# Altium footprint library AltiumLibraries.PcbLib: 247 footprints (part 15 of 16)
Each footprint in its own frame and in the unit in brackets; x right, y up, seen from the top. Pads: shape width x height; smd on the part's side, far side on the other; paste and mask are expansions set on the pad; w line width, h text height; cw(c..) or ccw(c..) is an arc to the next point about the centre after c.
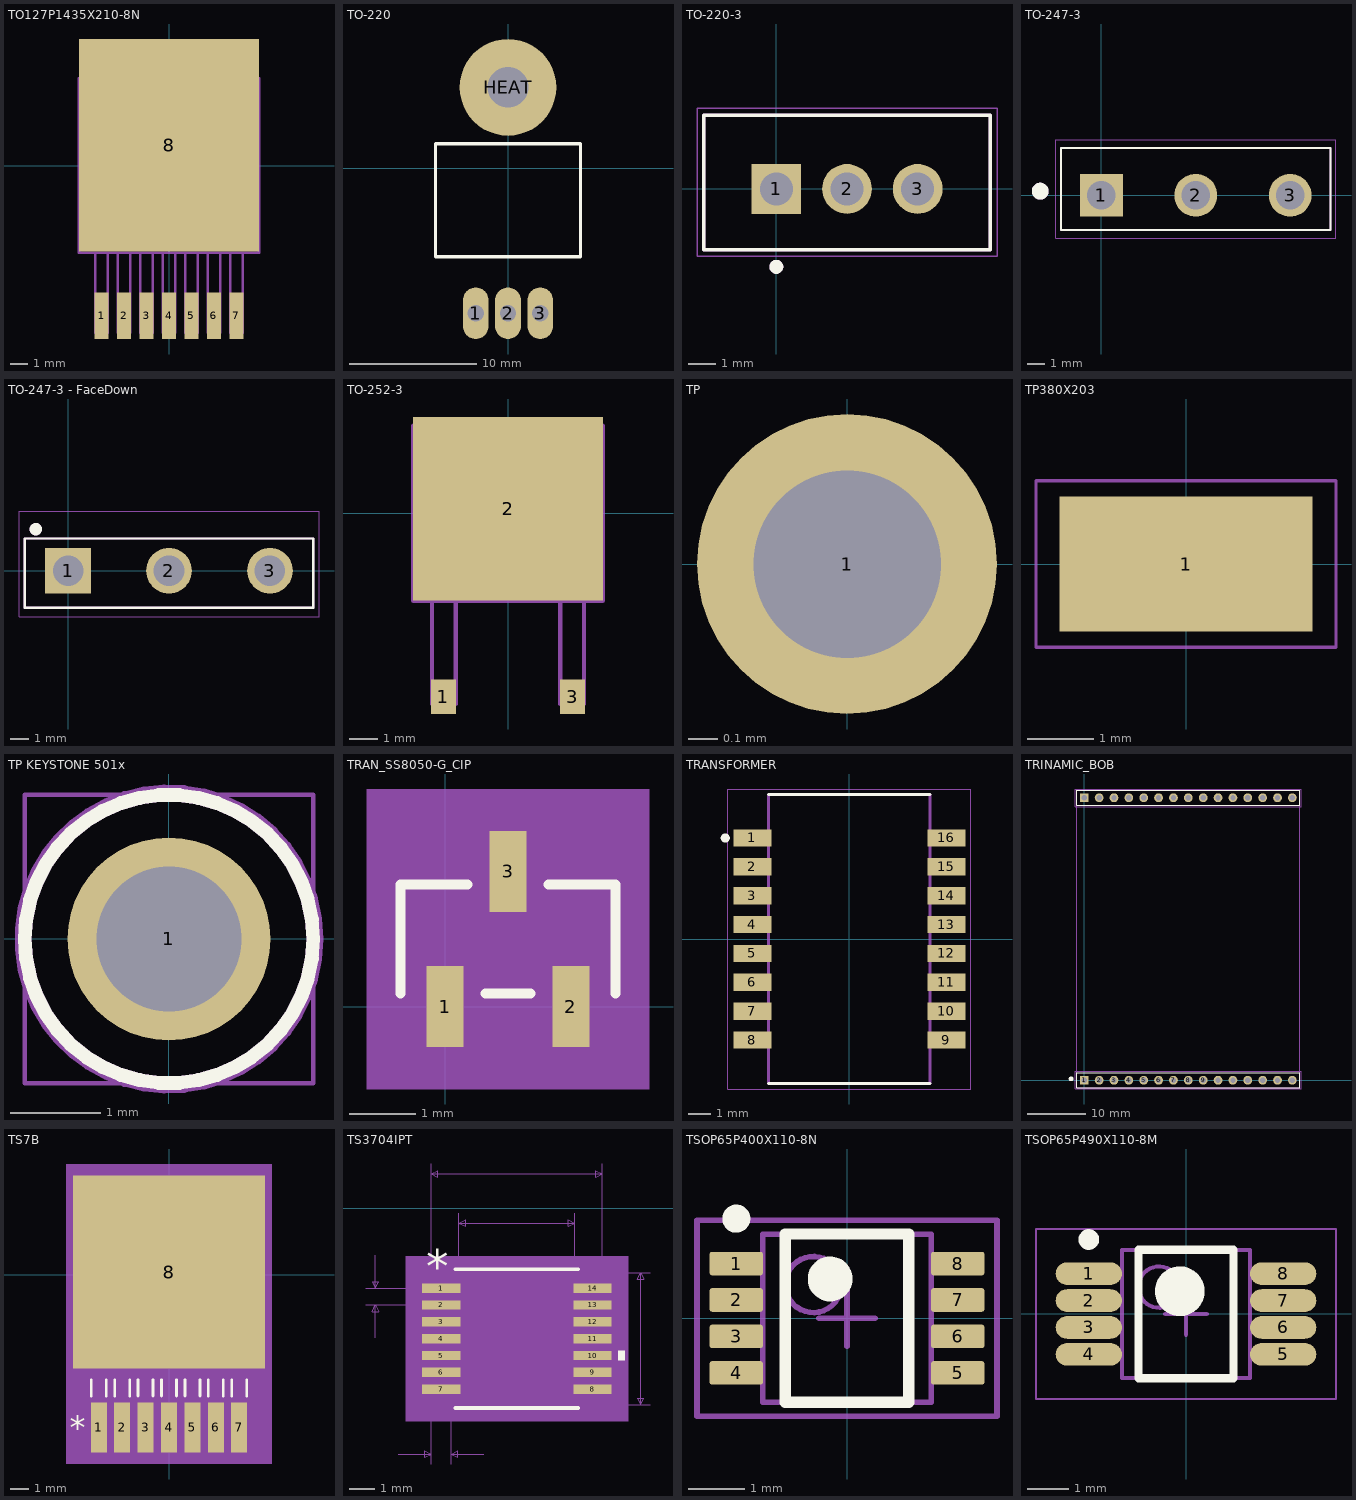
[diagram p14: the footprints below, top view; thin cyan lines are the x and y axes]

## TO127P1435X210-8N [mil]
pads (8):
  rect 31x103 smd: 1(-150,-334) 2(-100,-334) 3(-50,-334) 4(0,-334) 5(50,-334) 6(100,-334) 7(150,-334)
  rect 400x472.44 smd: 8(0,45.28)
Mechanical 13:
  lines w6: -200,-194 -200,194 200,194 200,-194 -200,-194 ; -164,-371 -136,-371 -136,-194 -164,-194 -164,-371 ; -114,-371 -86,-371 -86,-194 -114,-194 -114,-371 ; -64,-371 -36,-371 -36,-194 -64,-194 -64,-371 ; -14,-371 14,-371 14,-194 -14,-194 -14,-371 ; 36,-371 64,-371 64,-194 36,-194 36,-371 ; 86,-371 114,-371 114,-194 86,-194 86,-371 ; 136,-371 164,-371 164,-194 136,-194 136,-371
3D body "NDR0007A.stp": height 78.74, standoff -6.63, extent -200,-355.55 200,196.06

## TO-220 [mil]
pads (4):
  oval 80x160 hole 50: 1(-100,-450) 2(0,-450) 3(100,-450)
  round 300 hole 126: HEAT(0,250)
Top Overlay:
  lines w10: -225,-275 -225,75 225,75 225,-275 -225,-275

## TO-220-3 [mm]
pads (3):
  rect 1.79x1.79 hole 1.19: 1(0,0)
  round 1.79 hole 1.19: 2(2.54,0) 3(5.08,0)
Top Overlay:
  circle w0.3: c0,-2.8 r0.1
  lines w0.127: -2.6,-2.18 7.68,-2.18 7.68,2.64 -2.6,2.64 -2.6,-2.18
Mechanical 4:
  circle w0.3: c0,-2.8 r0.1
  circle w0.3: c0,-2.8 r0.1
  lines w0.127: -2.6,-2.18 -2.6,2.64 ; -2.6,-2.18 7.68,-2.18 ; -2.6,-2.18 -2.6,2.64 ; -2.6,-2.18 7.68,-2.18 ; -2.6,2.64 7.68,2.64 ; -2.6,2.64 7.68,2.64 ; 7.68,-2.18 7.68,2.64 ; 7.68,-2.18 7.68,2.64
Mechanical 16:
  lines w0.05: -2.85,-2.427 -2.85,2.893 7.93,2.893 7.93,-2.427 -2.85,-2.427

## TO-247-3 [mm]
pads (3):
  rect 2.52x2.52 hole 1.68: 1(0,0)
  round 2.52 hole 1.68: 2(5.56,0) 3(11.12,0)
Top Overlay:
  circle w0.5: c-3.6,0.24 r0.25
  lines w0.127: -2.38,-2.04 13.5,-2.04 13.5,2.78 -2.38,2.78 -2.38,-2.04
Mechanical 13:
  circle w0.5: c-3.6,0.24 r0.25
  lines w0.127: -2.38,-2.04 13.5,-2.04 13.5,2.78 -2.38,2.78 -2.38,-2.04
Mechanical 15:
  lines w0.05: -2.7,-2.53 13.82,-2.53 13.82,3.27 -2.7,3.27 -2.7,-2.53
3D body "TO-247 CASE 340L-02 Horizontal Bottom.STEP": height 6.3, standoff -12, extent -2.44,-25.55 13.56,0.35

## TO-247-3 - FaceDown [mm]
pads (3):
  rect 2.52x2.52 hole 1.68: 1(0,0)
  round 2.52 hole 1.68: 2(5.56,0) 3(11.12,0)
Top Overlay:
  circle w0.381: c-1.778,2.286 r0.152
  lines w0.127: -2.38,-2.04 -2.38,1.778 13.5,1.778 13.5,-2.04 -2.38,-2.04
Mechanical 13:
  circle w0.381: c-1.778,2.286 r0.152
  lines w0.127: -2.38,-2.04 13.5,-2.04 13.5,1.778 -2.38,1.778 -2.38,-2.04
Mechanical 15:
  lines w0.05: -2.7,-2.53 13.82,-2.53 13.82,3.27 -2.7,3.27 -2.7,-2.53
3D body "User Library-TO-247_bent_leads.step": height 5.5, standoff -6.5, extent -2.39,-26.582 13.51,0.4

## TO-252-3 [mil]
pads (3):
  rect 35x48 smd: 1(-90,-256) 3(90,-256)
  rect 265x256 smd: 2(0,6)
Mechanical 4:
  lines w6: -132,-122 132,-122 ; -132,-122 -132,122 ; -132,-122 132,-122 ; -132,-122 -132,122 ; -132,122 132,122 ; -132,122 132,122 ; -106,-266 -106,-122 ; -106,-266 -73,-266 ; -106,-266 -106,-122 ; -106,-266 -73,-266 ; -106,-122 -73,-122 ; -106,-122 -73,-122 ; -73,-266 -73,-122 ; -73,-266 -73,-122 ; 73,-266 73,-122 ; 73,-266 106,-266 ; 73,-266 73,-122 ; 73,-266 106,-266 ; 73,-122 106,-122 ; 73,-122 106,-122 ; 106,-266 106,-122 ; 106,-266 106,-122 ; 132,-122 132,122 ; 132,-122 132,122

## TP [mil] "Test point (40mil Standard)"
pads (1):
  round 40 hole 25: 1(0,0)

## TP380X203 [mm]
pads (1):
  rect 3.8x2.03 smd: 1(0,0)
Mechanical 15:
  lines w0.05: -2.25,-1.25 2.25,-1.25 2.25,1.25 -2.25,1.25 -2.25,-1.25

## TP KEYSTONE 501x [mil] "Keystone 5010-5014 & 5125-5129"
pads (1):
  round 88 hole 63: 1(0,0)
Top Overlay:
  circle w6: c0,0 r62.48
Mechanical 13:
  circle w6: c0,0 r62.48
  lines w1.97: -62.6,-62.47 62.6,-62.47 62.6,62.48 -62.6,62.48 -62.6,-62.47
Mechanical 15:
  circle w3.94: c0,0 r65
3D body "5012 (White).step": height 320.08, standoff -124.8, extent -62.6,-62.47 62.6,62.47

## TRAN_SS8050-G_CIP [mil]
pads (3):
  rect 22x48 smd paste+0 mask+0: 1(0,0) 2(74.8,0) 3(37.4,80.39)
Top Overlay:
  lines w6: -26.6,7.7 -26.6,72.7 13.3,72.7 ; 24.1,7.7 50.7,7.7 ; 61.5,72.7 101.4,72.7 101.4,7.7
Mechanical 5:
  region: -46.6,129.39 121.4,129.39 121.4,-49 -46.6,-49
Mechanical 13:
  lines w1: -21.6,12.7 96.4,12.7 96.4,67.7 -21.6,67.7 -21.6,12.7 ; -10,-10 -10,12.7 10,12.7 10,-10 -10,-10 ; 27.4,67.7 47.4,67.7 47.4,90.39 27.4,90.39 27.4,67.7 ; 64.8,-10 64.8,12.7 84.8,12.7 84.8,-10 64.8,-10
Mechanical 15:
  region: -31.6,2.7 -31.6,77.7 17.4,77.7 17.4,114.39 57.4,114.39 57.4,77.7 106.4,77.7 106.4,2.7 94.8,2.7 94.8,-34 -20,-34 -20,2.7
  lines w6: -31.6,2.7 -31.6,77.7 17.4,77.7 17.4,114.39 57.4,114.39 57.4,77.7 106.4,77.7 106.4,2.7 94.8,2.7 94.8,-34 -20,-34 -20,2.7 -31.6,2.7
3D body "TRAN_SS8050-G_CIP.step": height 41.1, standoff 0, extent -21.61,-10 96.42,90.39

## TRANSFORMER [mm]
pads (16):
  rect 1.67x0.76 smd: 1(-4.265,4.445) 2(-4.265,3.175) 3(-4.265,1.905) 4(-4.265,0.635) 5(-4.265,-0.635) 6(-4.265,-1.905) 7(-4.265,-3.175) 8(-4.265,-4.445) 9(4.265,-4.445) 10(4.265,-3.175) 11(4.265,-1.905) 12(4.265,-0.635) 13(4.265,0.635) 14(4.265,1.905) 15(4.265,3.175) 16(4.265,4.445)
Top Overlay:
  circle w0.2: c-5.461,4.445 r0.1
  lines w0.127: -3.555,-6.35 3.555,-6.35 ; -3.555,6.35 3.555,6.35
Mechanical 4:
  lines w0.127: -3.555,-6.35 -3.555,6.35 ; -3.555,-6.35 3.555,-6.35 ; -3.555,-6.35 -3.555,6.35 ; -3.555,-6.35 3.555,-6.35 ; -3.555,6.35 3.555,6.35 ; -3.555,6.35 3.555,6.35 ; 3.555,-6.35 3.555,6.35 ; 3.555,-6.35 3.555,6.35
Mechanical 15:
  lines w0.05: -5.35,-6.6 -5.35,6.6 5.35,6.6 5.35,-6.6 -5.35,-6.6

## TRINAMIC_BOB [mm]
pads (30):
  rect 1.5x1.5 hole 0.9: 1(0,0) 16(0,48.26)
  round 1.5 hole 0.9: 2(2.54,0) 3(5.08,0) 4(7.62,0) 5(10.16,0) 6(12.7,0) 7(15.24,0) 8(17.78,0) 9(20.32,0) 10(22.86,0) 11(25.4,0) 12(27.94,0) 13(30.48,0) 14(33.02,0) 15(35.56,0) 17(2.54,48.26) 18(5.08,48.26) 19(7.62,48.26) 20(10.16,48.26) 21(12.7,48.26) 22(15.24,48.26) 23(17.78,48.26) 24(20.32,48.26) 25(22.86,48.26) 26(25.4,48.26) 27(27.94,48.26) 28(30.48,48.26) 29(33.02,48.26) 30(35.56,48.26)
Top Overlay:
  circle w0.6: c-2.25,0.25 r0.1
  lines w0.2: -1.27,-1.27 36.83,-1.27 36.83,1.27 -1.27,1.27 -1.27,-1.27 ; -1.27,46.99 36.83,46.99 36.83,49.53 -1.27,49.53 -1.27,46.99
Mechanical 13:
  lines w0.2: -1.27,49.53 36.83,49.53 ; -1.27,49.53 -1.27,46.99 36.83,46.99 36.83,49.53 ; -1.27,49.53 36.83,49.53 ; -1.27,49.53 -1.27,-1.27 36.83,-1.27 36.83,49.53
Mechanical 15:
  lines w0.1: -1.5,-1.5 -1.5,1.5 37.12,1.5 37.12,-1.5 -1.5,-1.5 ; -1.5,46.76 -1.5,49.76 37.12,49.76 37.12,46.76 -1.5,46.76
3D body: height 11, standoff 5, extent -1.27,-1.27 36.83,49.523

## TS7B [mil]
pads (8):
  rect 34x106 smd: 1(-150,-326) 2(-100,-326) 3(-50,-326) 4(0,-326) 5(50,-326) 6(100,-326) 7(150,-326)
  rect 410x412 smd: 8(0,6)
Top Overlay:
  lines w6: -166,-259 -166,-224 ; -134,-259 -134,-224 ; -116,-259 -116,-224 ; -84,-259 -84,-224 ; -66,-259 -66,-224 ; -34,-259 -34,-224 ; -16,-259 -16,-224 ; 16,-259 16,-224 ; 34,-259 34,-224 ; 66,-259 66,-224 ; 84,-259 84,-224 ; 116,-259 116,-224 ; 134,-259 134,-224 ; 166,-259 166,-224
  text "*" at -212.5,-351 h50
Mechanical 5:
  region: -220,237 220,237 220,-404 -220,-404
Mechanical 13:
  lines w1: -205,-200 -205,200 205,200 205,-200 -205,-200 ; -166,-365 -134,-365 -134,-200 -166,-200 -166,-365 ; -116,-365 -84,-365 -84,-200 -116,-200 -116,-365 ; -66,-365 -34,-365 -34,-200 -66,-200 -66,-365 ; -16,-365 16,-365 16,-200 -16,-200 -16,-365 ; 34,-365 66,-365 66,-200 34,-200 34,-365 ; 84,-365 116,-365 116,-200 84,-200 84,-365 ; 134,-365 166,-365 166,-200 134,-200 134,-365
  text "*" at -212.5,-351 h50
Mechanical 15:
  region: 215,-389 -215,-389 -215,222 215,222
  lines w6: -215,-389 215,-389 215,222 -215,222 -215,-389
3D body "TS7B.step": height 189.09, standoff -2.01, extent -205,-277.52 205,200.12

## TS3704IPT [mil]
pads (14):
  rect 58x14 smd paste+0 mask+0: 1(1060.59,-121.18) 2(1060.59,-146.77) 3(1060.59,-172.36) 4(1060.59,-197.95) 5(1060.59,-223.54) 6(1060.59,-249.13) 7(1060.59,-274.72) 8(1290.59,-274.72) 9(1290.59,-249.13) 10(1290.59,-223.54) 11(1290.59,-197.95) 12(1290.59,-172.36) 13(1290.59,-146.77) 14(1290.59,-121.18)
Top Overlay:
  region: 1329.59,-216.04 1339.59,-216.04 1339.59,-231.04 1329.59,-231.04
  lines w6: 1082.59,-303.45 1268.59,-303.45 ; 1082.59,-92.45 1268.59,-92.45
  text "*" at 1038.09,-112.18 h50
Mechanical 5:
  region: 1344.59,-323.45 1006.59,-323.45 1006.59,-72.45 1344.59,-72.45
Mechanical 7:
  lines w1: 945.59,-146.77 1060.59,-146.77 ; 945.59,-121.18 1060.59,-121.18 ; 960.59,-196.77 960.59,-146.77 ; 960.59,-71.18 960.59,-121.18 ; 995.59,-373.45 1045.59,-373.45 ; 1045.59,-388.45 1045.59,-197.95 1045.59,67.55 ; 1075.59,-388.45 1075.59,-197.95 ; 1087.59,-197.95 1087.59,-7.45 ; 1125.59,-373.45 1075.59,-373.45 ; 1175.59,-298.45 1378.59,-298.45 ; 1175.59,-97.45 1378.59,-97.45 ; 1263.59,-197.95 1263.59,-7.45 ; 1305.59,-197.95 1305.59,67.55 ; 960.59,-146.77 965.59,-156.77 955.59,-156.77 960.59,-146.77 ; 960.59,-121.18 965.59,-111.18 955.59,-111.18 960.59,-121.18 ; 1045.59,-373.45 1035.59,-378.45 1035.59,-368.45 1045.59,-373.45 ; 1045.59,52.55 1055.59,47.55 1055.59,57.55 1045.59,52.55 ; 1045.59,52.55 1305.59,52.55 ; 1075.59,-373.45 1085.59,-378.45 1085.59,-368.45 1075.59,-373.45 ; 1087.59,-22.45 1097.59,-27.45 1097.59,-17.45 1087.59,-22.45 ; 1087.59,-22.45 1263.59,-22.45 ; 1263.59,-22.45 1253.59,-27.45 1253.59,-17.45 1263.59,-22.45 ; 1305.59,52.55 1295.59,47.55 1295.59,57.55 1305.59,52.55 ; 1363.59,-298.45 1368.59,-288.45 1358.59,-288.45 1363.59,-298.45 ; 1363.59,-298.45 1363.59,-97.45 ; 1363.59,-97.45 1368.59,-107.45 1358.59,-107.45 1363.59,-97.45
  text "0.03in/0.762mm" at 973.09,-418.45 h25
  text "0.026in/0.65mm" at 765.59,-146.48 h25
  text "0.201in/5.105mm" at 1383.59,-210.45 h25
  text "0.26in/6.604mm" at 1088.09,72.55 h25
  text "0.176in/4.47mm" at 1088.09,-2.45 h25
  text "Alt 2 Padstyle: OX90Y60D30P" at 838.09,-798.45 h50
  text "Alt 1 Padstyle: OX60Y90D30P" at 838.09,-738.45 h50
  text "Pin One Padstyle: RX58Y14D0T" at 825.59,-558.45 h50
  text "Default Padstyle: RX58Y14D0T" at 825.59,-498.45 h50
Mechanical 13:
  lines w0: 1163.59,-97.45 ccw(c1175.59,-97.45) 1187.59,-97.45
  lines w1: 1045.59,-280.72 1087.59,-280.72 1087.59,-268.72 1045.59,-268.72 1045.59,-280.72 ; 1045.59,-255.13 1087.59,-255.13 1087.59,-243.13 1045.59,-243.13 1045.59,-255.13 ; 1045.59,-229.54 1087.59,-229.54 1087.59,-217.54 1045.59,-217.54 1045.59,-229.54 ; 1045.59,-203.95 1087.59,-203.95 1087.59,-191.95 1045.59,-191.95 1045.59,-203.95 ; 1045.59,-178.36 1087.59,-178.36 1087.59,-166.36 1045.59,-166.36 1045.59,-178.36 ; 1045.59,-152.77 1087.59,-152.77 1087.59,-140.77 1045.59,-140.77 1045.59,-152.77 ; 1045.59,-127.18 1087.59,-127.18 1087.59,-115.18 1045.59,-115.18 1045.59,-127.18 ; 1087.59,-298.45 1087.59,-97.45 1263.59,-97.45 1263.59,-298.45 1087.59,-298.45 ; 1263.59,-280.72 1305.59,-280.72 1305.59,-268.72 1263.59,-268.72 1263.59,-280.72 ; 1263.59,-255.13 1305.59,-255.13 1305.59,-243.13 1263.59,-243.13 1263.59,-255.13 ; 1263.59,-229.54 1305.59,-229.54 1305.59,-217.54 1263.59,-217.54 1263.59,-229.54 ; 1263.59,-203.95 1305.59,-203.95 1305.59,-191.95 1263.59,-191.95 1263.59,-203.95 ; 1263.59,-178.36 1305.59,-178.36 1305.59,-166.36 1263.59,-166.36 1263.59,-178.36 ; 1263.59,-152.77 1305.59,-152.77 1305.59,-140.77 1263.59,-140.77 1263.59,-152.77 ; 1263.59,-127.18 1305.59,-127.18 1305.59,-115.18 1263.59,-115.18 1263.59,-127.18
  text "*" at 1090.09,-150.45 h50
Mechanical 15:
  region: 1077.59,-291.72 1021.59,-291.72 1021.59,-104.18 1077.59,-104.18 1077.59,-87.45 1273.59,-87.45 1273.59,-104.18 1329.59,-104.18 1329.59,-291.72 1273.59,-291.72 1273.59,-308.45 1077.59,-308.45
  lines w6: 1021.59,-291.72 1077.59,-291.72 1077.59,-308.45 1273.59,-308.45 1273.59,-291.72 1329.59,-291.72 1329.59,-104.18 1273.59,-104.18 1273.59,-87.45 1077.59,-87.45 1077.59,-104.18 1021.59,-104.18 1021.59,-291.72
3D body "TSSOP14_STM.step": height 47.09, standoff 0, extent 1045.6,-298.46 1305.6,-97.44
3D body: height 10, standoff 0, extent 1175.59,-197.95 1185.59,-187.95

## TSOP65P400X110-8N [mm] "TSOP, 8-Leads, Body 3.00x3.00mm, Pitch 0.65mm, IPC Medium Density"
height 1.1
pads (8):
  rrect20% 0.95x0.42 smd mask+0.065: 1(-1.975,0.975) 2(-1.975,0.325) 3(-1.975,-0.325) 4(-1.975,-0.975) 5(1.975,-0.975) 6(1.975,-0.325) 7(1.975,0.325) 8(1.975,0.975)
Top Overlay:
  circle w0.4: c-0.3,0.7 r0.2
  circle w0.25: c-1.975,1.775 r0.125
  lines w0.2: -1.1,-1.5 1.1,-1.5 1.1,1.5 -1.1,1.5 -1.1,-1.5
Mechanical 13:
  circle w0.1: c-0.6,0.6 r0.5
  lines w0.1: -1.5,-1.5 1.5,-1.5 1.5,1.5 -1.5,1.5 -1.5,-1.5
Mechanical 15:
  lines w0.1: -0.5,0 0.5,0 ; 0,-0.5 0,0.5 ; -2.675,-1.75 2.675,-1.75 2.675,1.75 -2.675,1.75 -2.675,-1.75
3D body "TSOP65P400X110-8N.step": height 1.1, standoff 0, extent -2,-1.5 2,1.5

## TSOP65P490X110-8M [mm] "TSOP, 8-Leads, Body 3.00x3.00mm, Pitch 0.65mm, IPC Low Density"
height 1.1
pads (8):
  oval 1.6x0.55 smd: 1(-2.35,0.975) 2(-2.35,0.325) 3(-2.35,-0.325) 4(-2.35,-0.975) 5(2.35,-0.975) 6(2.35,-0.325) 7(2.35,0.325) 8(2.35,0.975)
Top Overlay:
  circle w0.25: c-2.35,1.8 r0.125
  circle w0.6: c-0.15,0.55 r0.3
  lines w0.2: -1.15,-1.55 -1.15,1.55 1.15,1.55 1.15,-1.55 -1.15,-1.55
Mechanical 13:
  circle w0.1: c-0.65,0.65 r0.5
  lines w0.1: -1.55,-1.55 -1.55,1.55 1.55,1.55 1.55,-1.55 -1.55,-1.55
Mechanical 15:
  lines w0.05: -3.625,-2.05 -3.625,2.05 3.625,2.05 3.625,-2.05 -3.625,-2.05
  lines w0.1: -0.5,0 0.5,0 ; 0,-0.5 0,0.5
3D body: height 1.1, standoff 0.05, extent -1.55,-1.55 1.55,1.55